# Altium integrated library new_lib.IntLib: 18 symbols
Pins are listed as number, name and electrical type; pins without a type are passive.

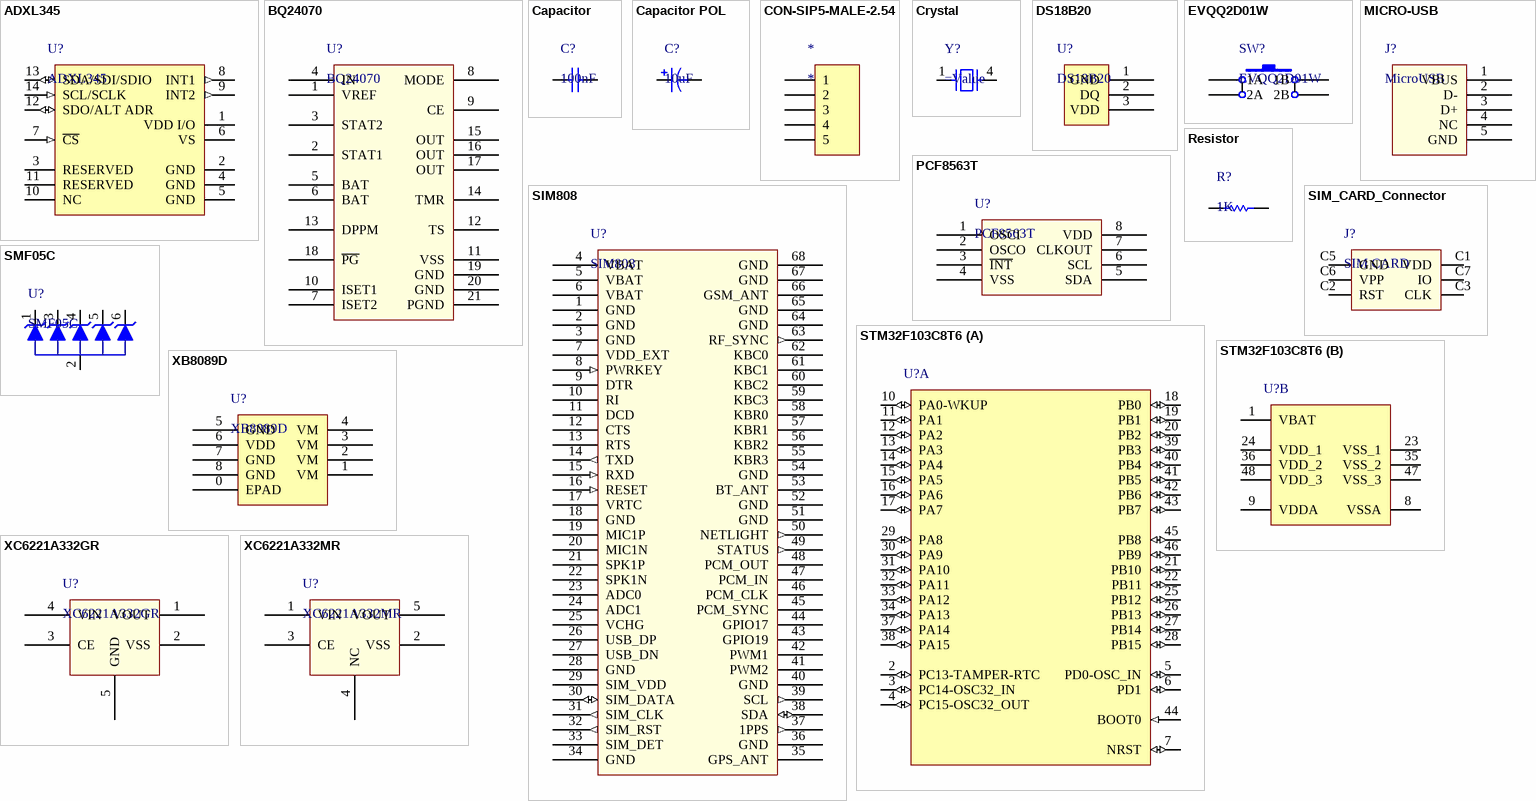
[diagram p0: symbols ADXL345 to XC6221A332MR]

## ADXL345
designator U?
三轴加速度传感器; Value: ADXL345
footprint LC-LGA-14_3x5mm
pins: 1 VDD I/O (power), 2 GND (power), 3 RESERVED, 4 GND (power), 5 GND (power), 6 VS (power), 7 ~{CS} (in), 8 INT1 (out), 9 INT2 (out), 10 NC, 11 RESERVED, 12 SDO/ALT ADR (io), 13 SDA/SDI/SDIO (io), 14 SCL/SCLK (in)

## BQ24070
designator U?
锂电池充电管理及系统电源路径管理芯片
footprint LC-QFN-20_3.5x4.5x05P
pins: 1 VREF (power), 2 STAT1 (power), 3 STAT2 (power), 4 IN (power), 5 BAT (power), 6 BAT (power), 7 ISET2 (power), 8 MODE (power), 9 CE (power), 10 ISET1 (power), 11 VSS (power), 12 TS (power), 13 DPPM (power), 14 TMR (power), 15 OUT (power), 16 OUT (power), 17 OUT (power), 18 ~{PG} (power), 19 GND (power), 20 GND (power), 21 PGND (power)

## Capacitor
designator C?, comment 100nF
Cap X7R 100nF 16V 10% smd0402; Value: 100nF
footprint LC-0201_C
footprint LC-0402_C
footprint LC-0603_C
footprint LC-0805_C
pins: 1, 2

## Capacitor POL
designator C?, comment 10uF
CAP TAN 10uF 16V 10% B3528; Value: 10uF
footprint LC-CASE-A_3216
footprint LC-CASE-B_3528
footprint LC-CASE-C_6032
footprint LC-CASE-D_7343
pins: 1, 2

## CON-SIP5-MALE-2.54
designator *
footprint CON-SIP-MALE-2.54
pins: 1, 2, 3, 4, 5

## Crystal
designator Y?
Crys 32.768kHz +/-20ppm MC-306; Vaule: 32.768kHz
footprint SU_MC306
pins: 1, 4

## DS18B20
designator U?
单线数字温度传感器; Value: DS18B20
footprint LC-TO-92(TO-92-3)
pins: 1 GND (power), 2 DQ (power), 3 VDD (power)

## EVQQ2D01W
designator SW?
四脚轻触按键
footprint CHEYA-SWITCH
pins: 1A, 1B, 2A, 2B

## MICRO-USB
designator J?, comment MicroUSB
MicroUSB接口，5pin，带直插的固定焊盘
footprint CHEYA-USB-Micro-5Pin
pins: 1 VBUS (power), 2 D- (power), 3 D+ (power), 4 NC (power), 5 GND (power)

## PCF8563T
designator U?
时钟芯片，i2c接口，带中断和时钟输出
footprint LC-SOIC-8_150mil
pins: 1 OSCI (power), 2 OSCO (power), 3 ~{INT} (power), 4 VSS (power), 5 SDA (power), 6 SCL (power), 7 CLKOUT (power), 8 VDD (power)

## Resistor
designator R?, comment 1K
Res 1K 1% 1/16W smd0402; Value: 1K
footprint LC-0201_R
footprint LC-0402_R
footprint LC-0603_R
footprint LC-0805_R
footprint LC-1206_R
footprint LC-1210_R
footprint LC-1806_R
footprint LC-1808_R
footprint LC-1812_R
footprint LC-1825_R
pins: 1, 2

## SIM808
designator U?
2G GPRS/GPS模块
footprint SIM808
pins: 1 GND (power), 2 GND (power), 3 GND (power), 4 VBAT (power), 5 VBAT (power), 6 VBAT (power), 7 VDD_EXT (power), 8 PWRKEY (in), 9 DTR (power), 10 RI (power), 11 DCD (power), 12 CTS (power), 13 RTS (power), 14 TXD (out), 15 RXD (in), 16 RESET (in), 17 VRTC (power), 18 GND (power), 19 MIC1P (power), 20 MIC1N (power), 21 SPK1P (power), 22 SPK1N (power), 23 ADC0 (power), 24 ADC1 (power), 25 VCHG (power), 26 USB_DP (power), 27 USB_DN (power), 28 GND (power), 29 SIM_VDD (power), 30 SIM_DATA (io), 31 SIM_CLK (out), 32 SIM_RST (out), 33 SIM_DET, 34 GND (power), 35 GPS_ANT (power), 36 GND (power), 37 1PPS (out), 38 SDA (io), 39 SCL (out), 40 GND (power), 41 PWM2 (power), 42 PWM1 (power), 43 GPIO19 (power), 44 GPIO17 (power), 45 PCM_SYNC (power), 46 PCM_CLK (power), 47 PCM_IN (power), 48 PCM_OUT (power), 49 STATUS (out), 50 NETLIGHT (out), 51 GND (power), 52 GND (power), 53 BT_ANT (power), 54 GND (power), 55 KBR3 (power), 56 KBR2 (power), 57 KBR1 (power), 58 KBR0 (power), 59 KBC3 (power), 60 KBC2 (power), 61 KBC1 (power), 62 KBC0 (power), 63 RF_SYNC (out), 64 GND (power), 65 GND (power), 66 GSM_ANT (power), 67 GND (power), 68 GND (power)

## SIM_CARD_Connector
designator J?, comment SIM CARD
Micro SIM卡座，6pin
footprint CON-Micro-SIM-6pin
pins: C1 VDD, C2 RST, C3 CLK, C5 GND, C6 VPP, C7 IO

## SMF05C
designator U?
TVS阵列，5个TVS管，ESD保护器件
footprint LC-SC-70-6(SOT-363)
pins: 1 K, 2 A, 3 K, 4 K, 5 K, 6 K

## STM32F103C8T6
designator U?
STM32 ARM-based 32-bit MCU Performance Line with 64 kB Flash, 20 kB Internal RAM, -40 to +85℃ Temperature, 48-Pin LQFP, Tray; DatasheetVersion: rev13.0, Apr-2011; PackageVersion: rev13, Apr-2011; PackageReference: LQFP48; PackageDescription: 48-Pin Low-Profile Quad Flat Pack, 7 x 7 mm Body, 0.5 mm Pitch (LQFP48); ComponentLink1Description: Manufacturer URL; ComponentLink1URL: http://www.st.com/; ComponentLink2Description: STM32F103 Datasheet; ComponentLink2URL: http://www.st.com/internet/com/TECHNICAL_RESOURCES/TECHNICAL_LITERATURE/DATASHEET/CD00161566.pdf; ComponentLink3Description: STM32 Family Web Page; ComponentLink3URL: www.st.com/stm32
footprint LC-LQFP-48_7x7x05P
part A pins: 2 PC13-TAMPER-RTC (io), 3 PC14-OSC32_IN (io), 4 PC15-OSC32_OUT (io), 5 PD0-OSC_IN (io), 6 PD1 (io), 7 NRST (io), 10 PA0-WKUP (io), 11 PA1 (io), 12 PA2 (io), 13 PA3 (io), 14 PA4 (io), 15 PA5 (io), 16 PA6 (io), 17 PA7 (io), 18 PB0 (io), 19 PB1 (io), 20 PB2 (io), 21 PB10 (io), 22 PB11 (io), 25 PB12 (io), 26 PB13 (io), 27 PB14 (io), 28 PB15 (io), 29 PA8 (io), 30 PA9 (io), 31 PA10 (io), 32 PA11 (io), 33 PA12 (io), 34 PA13 (io), 37 PA14 (io), 38 PA15 (io), 39 PB3 (io), 40 PB4 (io), 41 PB5 (io), 42 PB6 (io), 43 PB7 (io), 44 BOOT0 (in), 45 PB8 (io), 46 PB9 (io)
part B pins: 1 VBAT (power), 8 VSSA (power), 9 VDDA (power), 23 VSS_1 (power), 24 VDD_1 (power), 35 VSS_2 (power), 36 VDD_2 (power), 47 VSS_3 (power), 48 VDD_3 (power)

## XB8089D
designator U?
锂电池充放电保护芯片，过充电压4.25V，过放电压2.5V,过流保护电流值10A,导通电阻20mΩ; Value: XB8089D
footprint LC-SOP-8_EP_150mil
pins: 0 EPAD (power), 1 VM (power), 2 VM (power), 3 VM (power), 4 VM (power), 5 GND (power), 6 VDD (power), 7 GND (power), 8 GND (power)

## XC6221A332GR
designator U?
带有输出使能控制的LDO,3.3V,USP-4
footprint CHEYA-USP-4
pins: 1 VOUT (power), 2 VSS (power), 3 CE (power), 4 VIN (power), 5 GND (power)

## XC6221A332MR
designator U?
带有输出使能控制引脚的LDO,SOT-23-5
footprint LC-SOT-23-5
pins: 1 VIN (power), 2 VSS (power), 3 CE (power), 4 NC (power), 5 VOUT (power)